# Altium footprint library 1.07-二极管、整流桥.PcbLib: 74 footprints (part 1 of 5)
Each footprint in its own frame and in the unit in brackets; x right, y up, seen from the top. Pads: shape width x height; smd on the part's side, far side on the other; paste and mask are expansions set on the pad; w line width, h text height; cw(c..) or ccw(c..) is an arc to the next point about the centre after c.
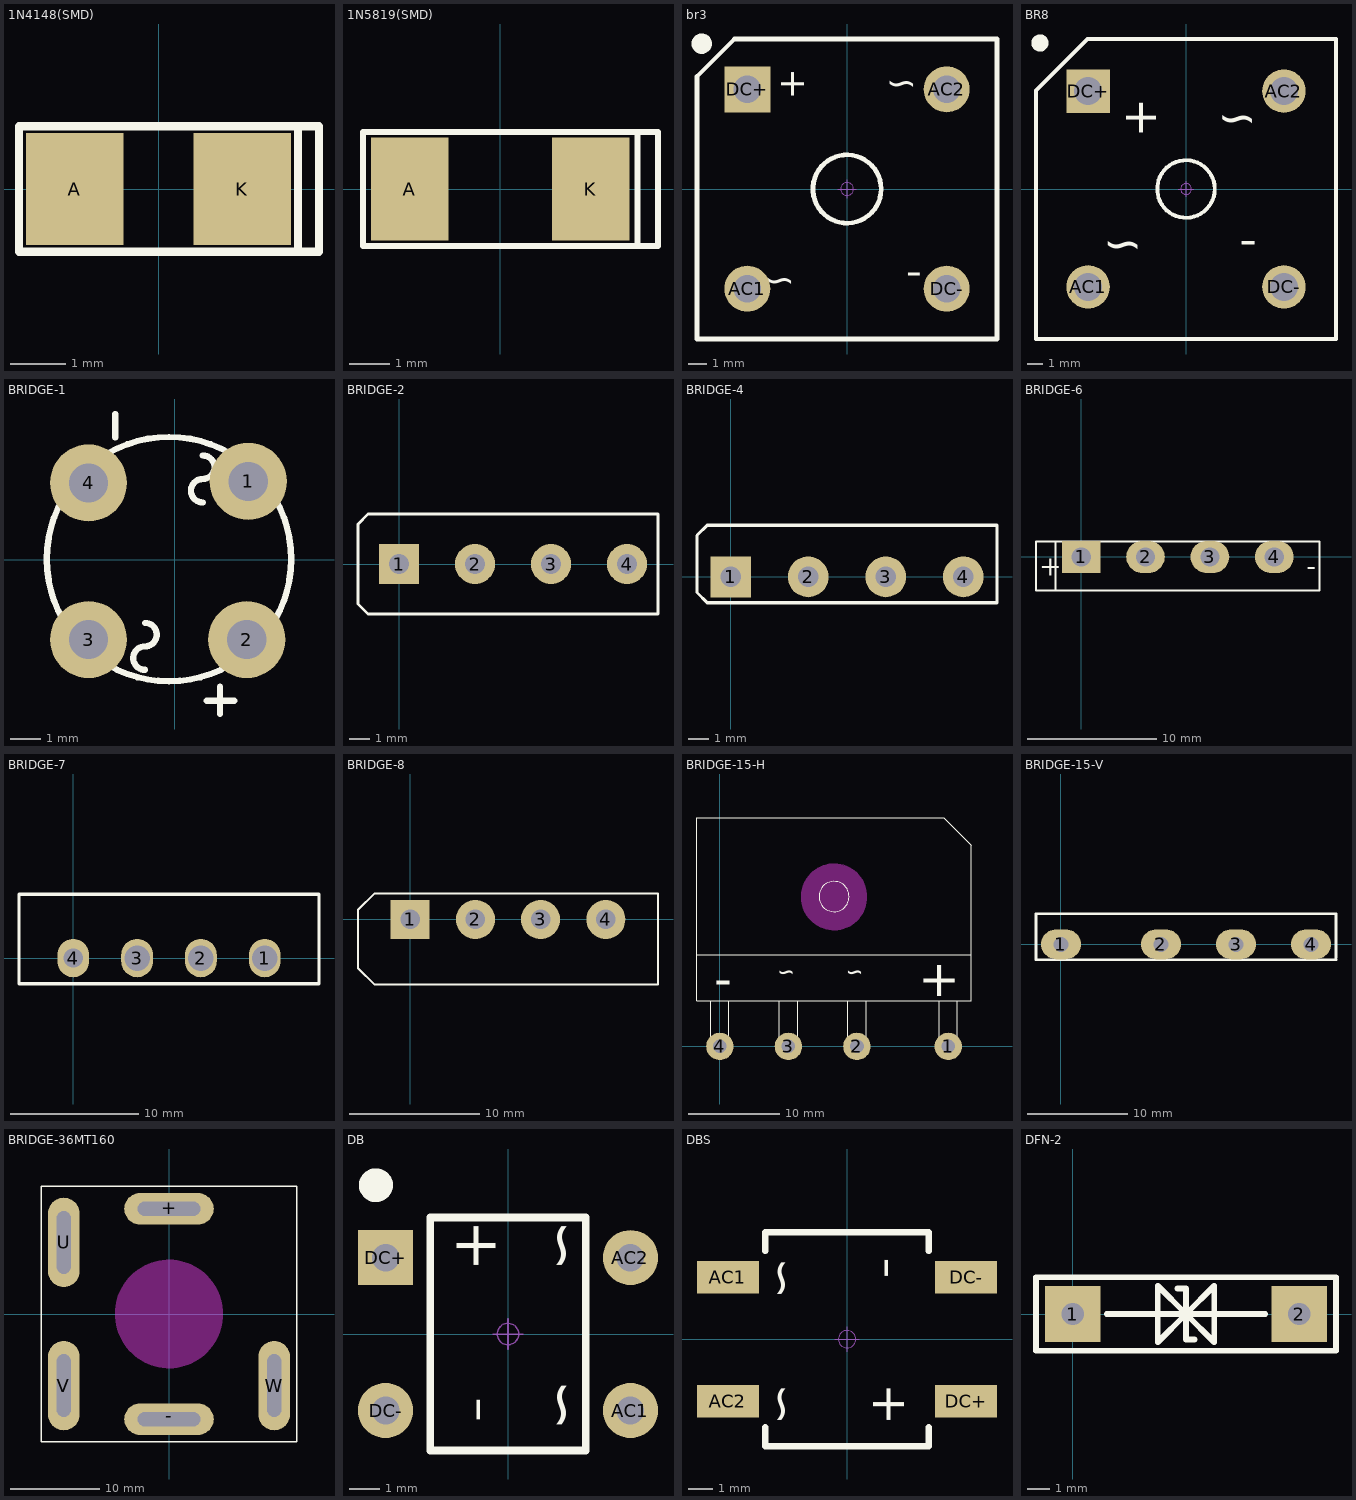
[diagram p0: the footprints below, top view; thin cyan lines are the x and y axes]

## 1N4148(SMD) [mil]
pads (2):
  rect 70x80 smd: A(-60,0) K(60,0)
Top Overlay:
  lines w5.91: 100,-45 100,45 ; -100,-45 115,-45 115,45 -100,45 -100,-45
3D body "1N4148(SMD).step": height 55.12, standoff 0, extent -68.9,-27.56 68.89,27.56

## 1N5819(SMD) [mil] "联系卖家 免费查找封装"
pads (2):
  rect 75x100 smd: A(-87.5,0) K(87.5,0)
Top Overlay:
  lines w5.91: 132.5,-55 132.5,55 ; -132.5,-55 152.5,-55 152.5,55 -132.5,55 -132.5,-55
3D body "User Library-DO-214AC SMA.step": height 94.69, standoff 0, extent -102.36,-51.18 102.36,51.18

## br3 [mm] "18*7.1mm(宽高)"
pads (4):
  round 2.5 hole 1.5: AC1(-5.4,-5.4) AC2(5.4,5.4) DC-(5.4,-5.4)
  rect 2.5x2.5 hole 1.5: DC+(-5.4,5.4)
Top Overlay:
  circle w0.254: c0,0 r1.85
  circle w0.6: c-7.874,7.874 r0.254
  lines w0.254: -8.128,-8.128 -8.128,6.096 -6.096,8.128 8.128,8.128 8.128,-8.128 -8.128,-8.128
  text "+" at -4.064,4.826 h2.54
  text "-" at 4.064,-5.842 h3.05
  text "~" at 3.81,4.572 h2.54
  text "~" at -2.794,-6.096 h2.54
Mechanical 15:
  circle w0.05: c0,0 r0.35
  lines w0.05: -0.5,0 0.5,0 ; 0,-0.5 0,0.5
3D body "BR3.STEP": height 6.13, standoff -3.37, extent -8.083,-8.012 7.917,7.988

## BR8 [mm] "16*8mm(宽高)"
pads (4):
  round 2.8 hole 1.8: AC1(-6.3,-6.3) AC2(6.3,6.3) DC-(6.3,-6.3)
  rect 2.8x2.8 hole 1.8: DC+(-6.3,6.3)
Top Overlay:
  circle w0.254: c0,0 r1.85
  circle w0.6: c-9.398,9.398 r0.254
  lines w0.254: -9.652,-9.652 -9.652,6.35 -6.35,9.652 9.652,9.652 9.652,-9.652 -9.652,-9.652
  text "+" at -4.572,3.302 h3.81
  text "-" at 4.572,-5.08 h4
  text "~" at 4.572,2.794 h3.81
  text "~" at -2.794,-5.334 h3.81
Mechanical 15:
  circle w0.05: c0,0 r0.35
  lines w0.05: -0.5,0 0.5,0 ; 0,-0.5 0,0.5
3D body "BR8.STEP": height 7.23, standoff -3.37, extent -9.45,-9.45 9.45,9.45

## BRIDGE-1 [mm] "联系卖家 免费查找封装"
pads (4):
  round 2.5 hole 1.27: 1(2.388,2.54) 2(2.337,-2.591) 3(-2.794,-2.591) 4(-2.794,2.489)
Top Overlay:
  circle w0.203: c-0.184,0.018 r3.962
  lines w0.203: -1.93,3.962 -1.93,4.724 ; -0.963,-3.573 cw(c-0.963,-3.192) -0.963,-2.811 ccw(c-0.963,-2.43) -0.963,-2.049 ; 0.91,1.856 cw(c0.91,2.237) 0.91,2.618 ccw(c0.91,2.999) 0.91,3.38 ; 1.041,-4.572 1.93,-4.572 ; 1.473,-5.004 1.473,-4.115
3D body "User Library-Silicon Bridge Rectifiers 2W10.STEP": height 7.62, standoff -10.38, extent -4.724,-4.449 4.276,4.551

## BRIDGE-2 [mm] "联系卖家 免费查找封装"
pads (4):
  rect 2x2 hole 1: 1(0,0)
  round 2 hole 1: 2(3.8,0) 3(7.6,0) 4(11.4,0)
Top Overlay:
  lines w0.15: -2.053,-1.997 -1.55,-2.5 12.95,-2.5 12.95,2.5 -1.55,2.5 -2.047,2.003 -2.053,2.003 -2.053,-1.997 ; -2.053,-1.997 -2.053,-1.997
3D body "User Library-3N246.step": height 12.59, standoff -13.79, extent -1.477,-2.419 13.243,2.425

## BRIDGE-4 [mm] "联系卖家免费查找封装"
pads (4):
  rect 2x2 hole 1: 1(0,0)
  round 2 hole 1: 2(3.8,0) 3(7.6,0) 4(11.4,0)
Top Overlay:
  lines w0.15: -1.65,-0.767 -1.147,-1.27 13.05,-1.27 13.05,2.53 -1.153,2.53 -1.65,2.033 -1.65,-0.767
3D body "零?": height 12.09, standoff -4.09, extent -1.665,-1.27 13.065,2.53

## BRIDGE-6 [mm] "淘宝ID:联系卖家免费查找封装"
pads (4):
  rect 3x2.5 hole 1.5: 1(0,0)
  oval 3x2.5 hole 1.5: 2(5,0) 3(10,0) 4(15,0)
Top Overlay:
  lines w0.15: -2,-2.6 -2,1.2 ; -3.5,-2.6 -3.5,1.2 18.5,1.2 18.5,-2.6 -3.5,-2.6
  text "-" at 18.261,-1.462 h1.52
  text "+" at -3.261,-1.462 h1.52
3D body "User Library-bridge 2.step": height 21, standoff -15.63, extent -3.65,-2.58 18.65,1.18

## BRIDGE-7 [mm] "淘宝ID:黄晶宝石   店铺网址:https://shop463601444.taobao.com"
pads (4):
  oval 2.5x3 hole 2: 1(15.001,0) 2(10,0) 3(5.001,0)
  oval 2.5x3 hole 1.5: 4(0,0)
Top Overlay:
  lines w0.254: -4.25,-2 -4.25,5 19.25,5 19.25,-2 -4.25,-2
3D body "User Library-bridge-9528.step": height 10.75, standoff -9.75, extent -2.509,-1.347 18.291,2.153

## BRIDGE-8 [mm] "淘宝ID:黄晶宝石   店铺网址:https://shop463601444.taobao.com"
pads (4):
  rect 3x3 hole 1.5: 1(0,0)
  round 3 hole 1.5: 2(5,0) 3(10,0) 4(15,0)
Top Overlay:
  lines w0.15: -2.725,-5.001 -4,-3.726 -4,0.725 -2.725,2 19,2 19,-5 -2.725,-5
3D body "User Library-KBU1010.step": height 19.74, standoff -27.96, extent -4.318,-5.069 19.396,2.032

## BRIDGE-15-H [mm]
pads (4):
  round 3 hole 1.5: 1(25,0) 2(15,0) 3(7.5,0) 4(0,0)
Top Overlay:
  circle w0.1: c12.5,16.4 r1.65
  lines w0.1: -2.5,10 27.5,10 ; -1,5 -1,1 -0.5,0.5 0.5,0.5 1,1 1,5 ; 6.5,5 6.5,1 7,0.5 8,0.5 8.5,1 8.5,5 ; 14,5 14,1 14.5,0.5 15.5,0.5 16,1 16,5 ; 24,5 24,1 24.5,0.5 25.5,0.5 26,1 26,5 ; 24.5,25 27.5,22 27.5,5 -2.5,5 -2.5,25 24.5,25 ; 24.5,25 24.5,25
  text "～" at 8.833,6.18 h4
  text "+" at 26.333,5.501 h4
  text "～" at 16.333,6.18 h4
  text "-" at 1.333,5.501 h4
Keep-Out Layer:
  board cut-out: 8.9,16.363 8.9,16.598 8.962,17.064 9.083,17.519 9.263,17.954 9.499,18.361 9.785,18.734 10.118,19.067 10.491,19.353 10.899,19.589 11.333,19.769 11.788,19.89 12.254,19.952 12.489,19.952 12.51,19.952 12.745,19.952 13.212,19.89 13.667,19.769 14.101,19.589 14.509,19.353 14.882,19.067 15.215,18.734 15.501,18.361 15.737,17.953 15.917,17.518 16.039,17.064 16.1,16.597 16.1,16.362 16.1,16.126 16.038,15.658 15.916,15.202 15.736,14.766 15.5,14.358 15.213,13.983 14.879,13.649 14.504,13.362 14.096,13.126 13.66,12.946 13.204,12.823 12.736,12.762 12.5,12.762 12.48,12.762 12.245,12.762 11.78,12.823 11.327,12.945 10.893,13.124 10.487,13.359 10.115,13.644 9.783,13.976 9.497,14.349 9.263,14.755 9.083,15.189 8.962,15.642 8.9,16.107 8.9,16.342
Keep-Out Layer:
  circle w0.1: c12.5,16.357 r3.6
3D body "bridge-15A-V.STEP": height 10, standoff -4.15, extent -2.5,-0.347 27.5,26.403

## BRIDGE-15-V [mm] "联系卖家 免费查找封装"
pads (4):
  oval 4x3 hole 1.5: 1(0,0) 2(10,0) 3(17.5,0) 4(25,0)
Top Overlay:
  lines w0.254: 27.5,-1.55 -2.5,-1.55 -2.5,3.05 27.5,3.05 27.5,-1.35
3D body "User Library-bridge-irxb25.STEP": height 24, standoff -13.5, extent -2.5,-1.55 27.5,3.05

## BRIDGE-36MT160 [mm]
pads (5):
  oval 10x3.5 hole 1.6 slot 7 at 0 deg: +(0,11.75) -(0,-11.75)
  oval 3.5x10 hole 1.6 slot 7 at 90 deg: U(-11.75,7.989) V(-11.75,-7.989) W(11.75,-7.989)
Top Overlay:
  lines w0.15: -14.25,-14.25 -14.25,14.25 14.25,14.25 14.25,-14.25 -14.25,-14.25
Keep-Out Layer:
  board cut-out: 6.001,0.006 6.001,0.3 5.943,0.887 5.828,1.464 5.657,2.028 5.432,2.572 5.154,3.092 4.827,3.581 4.453,4.037 4.037,4.453 3.582,4.827 3.092,5.154 2.572,5.432 2.028,5.657 1.465,5.828 0.887,5.943 0.301,6.001 0.006,6.001 -0.103,6.001 -0.489,6.001 -1.255,5.9 -2.002,5.7 -2.716,5.404 -3.385,5.018 -3.998,4.548 -4.545,4.001 -5.015,3.388 -5.401,2.719 -5.697,2.005 -5.897,1.258 -5.998,0.492 -5.998,0.106 -5.998,0.006 -5.998,-0.289 -5.94,-0.877 -5.825,-1.456 -5.653,-2.021 -5.427,-2.567 -5.149,-3.088 -4.821,-3.579 -4.446,-4.035 -4.029,-4.453 -3.572,-4.827 -3.081,-5.155 -2.561,-5.434 -2.015,-5.66 -1.45,-5.831 -0.871,-5.946 -0.283,-6.004 0.012,-6.004 0.017,-6.004 0.311,-6.004 0.896,-5.946 1.473,-5.832 2.035,-5.661 2.579,-5.436 3.097,-5.159 3.586,-4.832 4.041,-4.459 4.456,-4.044 4.829,-3.589 5.156,-3.1 5.433,-2.582 5.658,-2.038 5.829,-1.476 5.943,-0.899 6.001,-0.314 6.001,-0.02
Keep-Out Layer:
  circle w0.1: c0,0 r6
Mechanical 1:
  lines w0.1: -12.55,-10.989 ccw(c-11.75,-10.989) -10.95,-10.989 -10.95,-4.989 ccw(c-11.75,-4.989) -12.55,-4.989 -12.55,-10.989 ; -12.55,4.989 ccw(c-11.75,4.989) -10.95,4.989 -10.95,10.989 ccw(c-11.75,10.989) -12.55,10.989 -12.55,4.989 ; -3,-12.55 cw(c-3,-11.75) -3,-10.95 3,-10.95 cw(c3,-11.75) 3,-12.55 -3,-12.55 ; -3,10.95 cw(c-3,11.75) -3,12.55 3,12.55 cw(c3,11.75) 3,10.95 -3,10.95 ; 10.95,-10.989 ccw(c11.75,-10.989) 12.55,-10.989 12.55,-4.989 ccw(c11.75,-4.989) 10.95,-4.989 10.95,-10.989
3D body "User Library-36MT160-1.STEP": height 10.5, standoff -10.5, extent -14.25,-14.25 14.25,14.25

## DB [mm] "8.5*7.6*3mm(长宽高)"
pads (4):
  round 1.8 hole 0.9: AC1(4.004,-2.5) AC2(4.004,2.5) DC-(-4.004,-2.5)
  rect 1.8x1.8 hole 0.9: DC+(-4.004,2.5)
Top Overlay:
  circle w0.6: c-4.318,4.866 r0.254
  lines w0.254: -2.54,-3.81 -2.54,3.81 2.54,3.81 2.54,-3.81 -2.54,-3.81
  text "+" at -2.159,2.032 h2.54
  text "-" at -2.159,-2.921 h3.05
  text "~" at 0.635,2.032 h2.54
  text "~" at 0.635,-3.175 h2.54
Mechanical 15:
  circle w0.05: c0,0 r0.35
  lines w0.05: -0.5,0 0.5,0 ; 0,-0.5 0,0.5
3D body "DB.STEP": height 3.2, standoff -3.01, extent -4.436,-4.25 4.436,4.25

## DBS [mm] "8.5*10.1*3mm(长宽高)"
height 12.3
pads (4):
  rect 2.5x1.3 smd: AC1(-4.8,2.5) AC2(-4.8,-2.5) DC+(4.8,-2.5) DC-(4.8,2.5)
Top Overlay:
  lines w0.254: -3.302,-3.556 -3.302,-4.318 3.302,-4.318 3.302,-3.556 ; -3.302,3.556 -3.302,4.318 3.302,4.318 3.302,3.556
  text "+" at 2.794,-1.778 h2.54
  text "-" at 2.794,3.302 h3.05
  text "~" at -1.524,-1.778 h2.54
  text "~" at -1.524,3.302 h2.54
Mechanical 15:
  circle w0.05: c0,0 r0.35
  lines w0.05: -0.5,0 0.5,0 ; 0,-0.5 0,0.5
3D body "DBS.stp": height 3.15, standoff 0.03, extent -5.05,-4.25 5.05,4.25

## DFN-2 [mm] "1.0*0.6(长*宽）"
pads (2):
  rect 2.5x2.5 hole 1: 1(0,0) 2(10.16,0)
Top Overlay:
  lines w0.254: 1.524,0 8.636,0 ; 4.699,1.143 5.08,1.143 5.08,-1.143 5.461,-1.143 ; 5.08,0 6.35,1.27 6.35,-1.27 5.08,0 ; 5.08,0 3.81,1.27 3.81,-1.27 5.08,0 ; -1.651,-1.651 11.811,-1.651 11.811,1.651 -1.651,1.651 -1.651,-1.651